# Altium footprint library RDM_ALT_PCB.PcbLib: 171 footprints (part 10 of 11)
Each footprint in its own frame and in the unit in brackets; x right, y up, seen from the top. Pads: shape width x height; smd on the part's side, far side on the other; paste and mask are expansions set on the pad; w line width, h text height; cw(c..) or ccw(c..) is an arc to the next point about the centre after c.
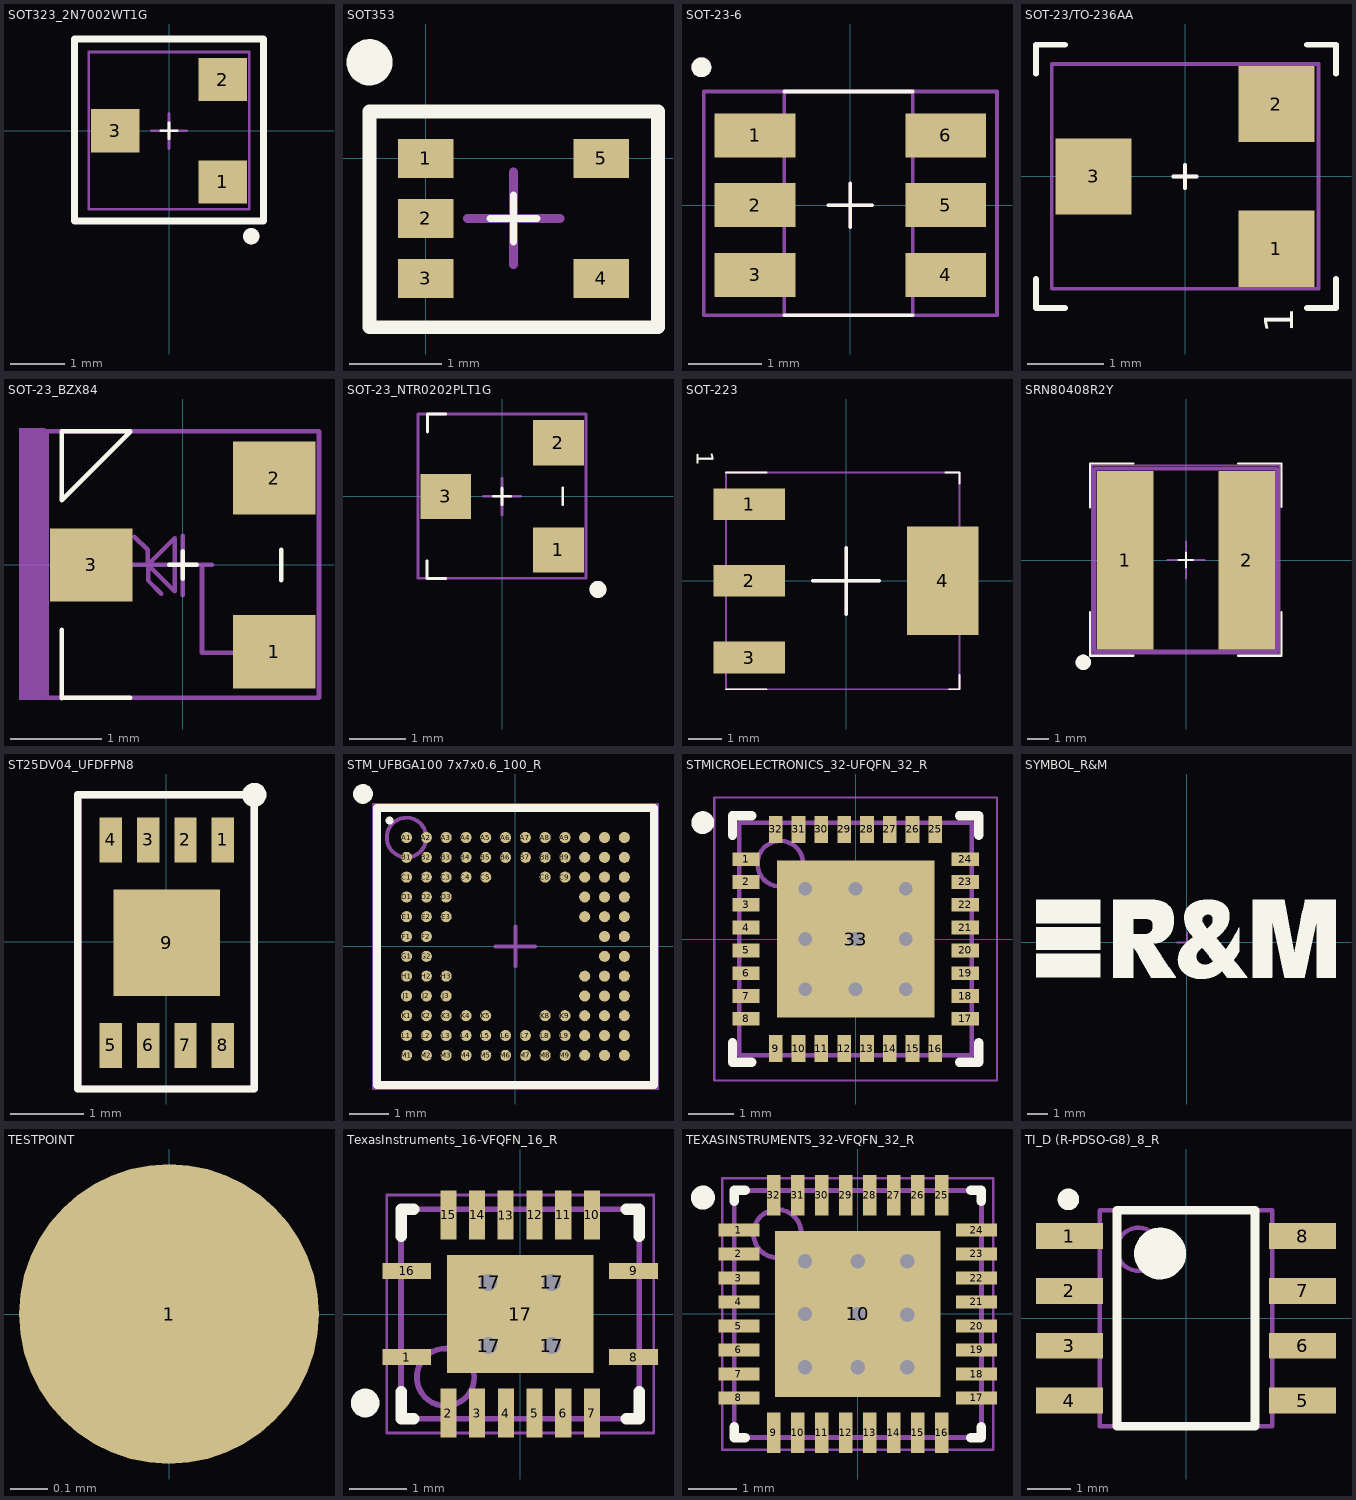
[diagram p9: the footprints below, top view; thin cyan lines are the x and y axes]

## SOT323_2N7002WT1G [mm] "N_MOSFET"
pads (3):
  rect 0.9x0.8 smd: 1(1,-0.95) 2(1,0.95) 3(-1,0)
Top Overlay:
  circle w0.3: c1.524,-1.956 r0
  lines w0.05: -0.15,0 0.15,0 ; 0,-0.15 0,0.15
  lines w0.127: -1.753,-1.676 -1.753,1.702 1.753,1.702 1.753,-1.676 -1.753,-1.676
Mechanical 13:
  circle w0.3: c1.524,-1.956 r0
Mechanical 15:
  circle w0.3: c1.524,-1.956 r0
  region: 0.669,-3.862
  region: 0.669,-3.862
  lines w0.05: -0.33,0 0,0 ; 0,-0.33 0,0 ; 0,-0.01 0,0.32 ; 0.33,0 0,0 ; -1.49,-1.455 -1.49,1.46 1.49,1.46 1.49,-1.455 -1.49,-1.455
3D body "BSS138_D87Z--3DModel-STEP-56544.STEP": height 1.16, standoff -0.04, extent -1.325,-1.46 1.075,1.46

## SOT353 [mm]
pads (5):
  rect 0.6x0.42 smd: 1(0,0) 2(0,-0.65) 3(0,-1.3) 4(1.9,-1.3) 5(1.9,0)
Top Overlay:
  circle w0.25: c-0.61,1.041 r0.125
  lines w0.076: 0.696,-0.65 1.204,-0.65 ; 0.95,-0.904 0.95,-0.396
  lines w0.15: -0.61,-1.829 2.515,-1.829 2.515,0.508 -0.61,0.508 -0.61,-1.829
Mechanical 15:
  lines w0.1: 0.45,-0.65 1.45,-0.65 ; 0.95,-1.15 0.95,-0.15
3D body "SOT353-1.stp": height 1.09, standoff 0, extent -0.18,-1.78 2.08,0.48

## SOT-23-6 [mm]
pads (6):
  rect 1.1x0.6 smd: 1(-1.3,0.95) 2(-1.3,0) 3(-1.3,-0.95) 4(1.3,-0.95) 5(1.3,0) 6(1.3,0.95)
Top Overlay:
  circle w0.15: c-2.032,1.88 r0.06
  lines w0.05: -0.9,-1.5 0.85,-1.5 ; -0.9,1.55 0.85,1.55 ; -0.3,0 0.3,0 ; 0,-0.3 0,0.3
Mechanical 13:
  circle w0.15: c-2.032,1.88 r0.06
  lines w0.05: -0.3,0 0.3,0 ; 0,-0.3 0,0.3 ; -0.9,-1.5 -0.9,1.55 0.85,1.55 0.85,-1.5 -0.9,-1.5
Mechanical 15:
  circle w0.15: c-2.031,1.88 r0.06
  lines w0.05: -0.3,0 0.3,0 ; 0,-0.3 0,0.3 ; -2,-1.5 2,-1.5 2,1.55 -2,1.55 -2,-1.5 ; -0.9,-1.5 -0.9,1.55 0.85,1.55 0.85,-1.5 -0.9,-1.5
3D body "3D-Body-SOT-23-6.step": height 1.09, standoff 0, extent -1.226,-1.397 1.2,1.397

## SOT-23/TO-236AA [mm] "TRANS NPN 20V 0.5A MINI3"
pads (3):
  rect 1x1 smd: 1(1.2,-0.95) 2(1.2,0.95) 3(-1.2,0)
Top Overlay:
  lines w0.05: -0.15,0 0.15,0 ; 0,-0.15 0,0.15
  lines w0.076: -1.956,-1.346 -1.956,-1.727 -1.575,-1.727 ; -1.956,1.346 -1.956,1.727 -1.575,1.727 ; 1.6,-1.727 1.981,-1.727 1.981,-1.346 ; 1.6,1.727 1.981,1.727 1.981,1.346
  text "1" at 1.422,-2.057 h0.38
Mechanical 13:
  lines w0.05: -0.15,0 0.15,0 ; 0,-0.15 0,0.15 ; -1.75,-1.475 1.75,-1.475 1.75,1.475 -1.75,1.475 -1.75,-1.475
Mechanical 15:
  region: 0.201,-0.951
  lines w0.05: -1.75,-1.475 1.75,-1.475 1.75,1.475 -1.75,1.475 -1.75,-1.475 ; -0.15,0 0.15,0 -0.15,0 ; 0,-0.15 0,0.15 0,-0.15
  text "B" at 0.65,-1.026 h0.25
  text "E" at 0.65,0.9 h0.25
  text "C" at -0.4,-0.1 h0.25
3D body "NPN_SOT-23_MINI3-G3-B.STEP": height 1.1, standoff -0.01, extent -1.29,-1.45 1.11,1.45

## SOT-23_BZX84 [mm] "only pin 3 and 1connected"
pads (3):
  rect 0.9x0.8 smd: 1(1,-0.95) 2(1,0.95) 3(-1,0)
Top Overlay:
  lines w0.05: -1.325,-1.46 -1.325,-0.709 ; -1.325,-1.455 -0.574,-1.455 ; -1.325,0.709 -1.325,1.46 -0.574,1.46 ; -1.323,0.709 -0.576,1.456 ; -0.15,0 0.15,0 ; 0,-0.15 0,0.15 ; 1.075,-0.17 1.075,0.165
Mechanical 13:
  rectangle: -1.79,-1.48 -1.5,1.5
Mechanical 15:
  circle w0.15: c-1.01,0 r0
  circle w0.15: c1.01,-0.96 r0
  rectangle: -1.791,-1.48 -1.501,1.5
  lines w0.05: -1.01,0 -0.39,0 ; -0.53,0.31 -0.385,0.165 -0.38,-0.17 -0.235,-0.315 ; -0.32,0 0.01,0 ; -0.09,0 0.21,0 0.21,-0.96 1.01,-0.96 ; -0.01,0 0.32,0 ; 0,-0.33 0,0 ; 0,-0.01 0,0.32 ; -1.49,-1.455 -1.49,1.46 1.49,1.46 1.49,-1.455 -1.49,-1.455 ; -0.38,0 -0.09,-0.29 -0.09,0.29 -0.38,0
3D body "BSS138_D87Z--3DModel-STEP-56544.STEP": height 1.16, standoff -0.04, extent -1.325,-1.46 1.075,1.46

## SOT-23_NTR0202PLT1G [mm] "P_MOSFET"
pads (3):
  rect 0.9x0.8 smd: 1(1,-0.95) 2(1,0.95) 3(-1,0)
Top Overlay:
  circle w0.3: c1.7,-1.65 r0
  lines w0.05: -1.33,-1.46 -1.33,-1.143 ; -1.325,-1.46 -1,-1.46 ; -1.325,1.143 -1.325,1.46 -1,1.46 ; -0.15,0 0.15,0 ; 0,-0.15 0,0.15 ; 1.075,-0.15 1.075,0.15
Mechanical 13:
  circle w0.3: c1.7,-1.65 r0
Mechanical 15:
  circle w0.3: c1.7,-1.65 r0
  region: 0.669,-3.862
  region: 0.669,-3.862
  lines w0.05: -0.33,0 0,0 ; 0,-0.33 0,0 ; 0,-0.01 0,0.32 ; 0.33,0 0,0 ; -1.49,-1.455 -1.49,1.46 1.49,1.46 1.49,-1.455 -1.49,-1.455
3D body "BSS138_D87Z--3DModel-STEP-56544.STEP": height 1.16, standoff -0.04, extent -1.325,-1.46 1.075,1.46

## SOT-223 [mm] "TO-261-4, TO-261AA"
pads (4):
  rect 2.15x0.95 smd: 1(-2.9,2.3) 2(-2.9,0) 3(-2.9,-2.3)
  rect 2.15x3.25 smd: 4(2.9,0)
Top Overlay:
  lines w0.05: -3.603,-3.252 -2.388,-3.251 ; -3.603,3.25 -2.388,3.251 ; 2.978,3.25 3.403,3.25 3.403,2.921 ; 3.074,-3.25 3.403,-3.25 3.403,-2.825
  lines w0.1: -1,0 1,0 ; 0,-1 0,1
  text "1" at -4.47,3.886 h0.5
Mechanical 13:
  lines w0.05: -3.603,-3.25 3.403,-3.25 3.403,3.25 -3.603,3.25 -3.603,-3.25
  lines w0.1: -1,0 1,0 ; 0,-1 0,1
  text "1" at -4.47,3.886 h0.5
Mechanical 15:
  lines w0.05: -0.3,0 0.3,0 ; -3.603,-3.25 -3.603,3.25 3.403,3.25 3.403,-3.25 -3.603,-3.25
  lines w0.1: -1,0 1,0 ; 0,-1 0,1
  text "1" at -4.47,3.886 h0.5
3D body "LD1117S18TR-3DModel.STEP": height 1.81, standoff -0.01, extent -3.603,-3.25 3.403,3.25

## SRN80408R2Y [mm]
pads (2):
  rect 2.6x8.2 smd: 1(-2.8,0) 2(2.8,0)
Top Overlay:
  lines w0.1: -4.42,-2.394 -4.42,-4.394 -2.42,-4.394 ; -4.42,2.42 -4.42,4.445 -2.429,4.445 ; -0.35,0 0.325,0 ; 0,-0.325 0,0.35 ; 2.394,-4.394 4.394,-4.394 4.394,-2.394 ; 2.394,4.445 4.394,4.445 4.394,2.445
  lines w0.5: -4.625,-4.7 ccw(c-4.725,-4.7) -4.625,-4.7
Mechanical 13:
  lines w0.1: -0.85,0 0.85,0 ; 0,-0.85 0,0.85
  lines w0.15: -4.2,-4.175 -4.2,4.2 4.175,4.2 4.175,-4.175 -4.2,-4.175
  lines w0.5: -4.625,-4.7 ccw(c-4.725,-4.7) -4.625,-4.7
Mechanical 15:
  lines w0.1: -0.85,0 0.85,0 ; 0,-0.85 0,0.85 ; -4.325,-4.3 4.3,-4.3 4.3,4.35 -4.325,4.35 -4.325,-4.3
  lines w0.5: -4.625,-4.7 ccw(c-4.725,-4.7) -4.625,-4.7
3D body "srn8040.stp": height 3.44, standoff -0.58, extent -4,-4 4,4.007

## ST25DV04_UFDFPN8 [mil] "UFDFPN8"
height 23.62
pads (9):
  rect 12x24 smd: 1(30.39,54.61) 2(10.39,54.61) 3(-9.61,54.61) 4(-29.61,54.61) 5(-29.61,-55.39) 6(-9.61,-55.39) 7(10.39,-55.39) 8(30.39,-55.39)
  rect 57.09x57.09 smd: 9(0.39,-0.39)
Top Overlay:
  circle w6.69: c47.24,78.74 r3.15
  lines w3.94: -47.24,-78.74 -47.24,78.74 ; -47.24,-78.74 47.24,-78.74 ; -47.24,-78.74 47.24,-78.74 ; -47.24,-78.74 -47.24,78.74 ; -47.24,-78.74 -47.24,78.74 ; -47.24,-78.74 47.24,-78.74 ; -47.24,-78.74 47.24,-78.74 ; -47.24,-78.74 -47.24,78.74 ; -47.24,78.74 47.24,78.74 ; -47.24,78.74 47.24,78.74 ; -47.24,78.74 47.24,78.74 ; -47.24,78.74 47.24,78.74 ; 47.24,-78.74 47.24,78.74 ; 47.24,-78.74 47.24,78.74 ; 47.24,-78.74 47.24,78.74 ; 47.24,-78.74 47.24,78.74
Mechanical 15:
  circle w3.94: c0,0 r1.97
  lines w3.94: -47.24,-78.74 47.24,-78.74 47.24,78.74 -47.24,78.74 -47.24,-78.74
3D body "User Library-UFDFPN8.STEP": height 22.16, standoff 0.5, extent -39.37,-59.06 39.37,59.06

## STM_UFBGA100 7x7x0.6_100_R [mm] "STM_UFBGA100 7x7x0.6_100_R"
height 0.6
pads (100):
  round 0.28 smd mask+0.09: A1(-2.75,2.75) A2(-2.25,2.75) A3(-1.75,2.75) A4(-1.25,2.75) A5(-0.75,2.75) A6(-0.25,2.75) A7(0.25,2.75) A8(0.75,2.75) A9(1.25,2.75) A10(1.75,2.75) A11(2.25,2.75) A12(2.75,2.75) B1(-2.75,2.25) B2(-2.25,2.25) B3(-1.75,2.25) B4(-1.25,2.25) B5(-0.75,2.25) B6(-0.25,2.25) B7(0.25,2.25) B8(0.75,2.25) B9(1.25,2.25) B10(1.75,2.25) B11(2.25,2.25) B12(2.75,2.25) C1(-2.75,1.75) C2(-2.25,1.75) C3(-1.75,1.75) C4(-1.25,1.75) C5(-0.75,1.75) C8(0.75,1.75) C9(1.25,1.75) C10(1.75,1.75) C11(2.25,1.75) C12(2.75,1.75) D1(-2.75,1.25) D2(-2.25,1.25) D3(-1.75,1.25) D10(1.75,1.25) D11(2.25,1.25) D12(2.75,1.25) E1(-2.75,0.75) E2(-2.25,0.75) E3(-1.75,0.75) E10(1.75,0.75) E11(2.25,0.75) E12(2.75,0.75) F1(-2.75,0.25) F2(-2.25,0.25) F11(2.25,0.25) F12(2.75,0.25) G1(-2.75,-0.25) G2(-2.25,-0.25) G11(2.25,-0.25) G12(2.75,-0.25) H1(-2.75,-0.75) H2(-2.25,-0.75) H3(-1.75,-0.75) H10(1.75,-0.75) H11(2.25,-0.75) H12(2.75,-0.75) J1(-2.75,-1.25) J2(-2.25,-1.25) J3(-1.75,-1.25) J10(1.75,-1.25) J11(2.25,-1.25) J12(2.75,-1.25) K1(-2.75,-1.75) K2(-2.25,-1.75) K3(-1.75,-1.75) K4(-1.25,-1.75) K5(-0.75,-1.75) K8(0.75,-1.75) K9(1.25,-1.75) K10(1.75,-1.75) K11(2.25,-1.75) K12(2.75,-1.75) L1(-2.75,-2.25) L2(-2.25,-2.25) L3(-1.75,-2.25) L4(-1.25,-2.25) L5(-0.75,-2.25) L6(-0.25,-2.25) L7(0.25,-2.25) L8(0.75,-2.25) L9(1.25,-2.25) L10(1.75,-2.25) L11(2.25,-2.25) L12(2.75,-2.25) M1(-2.75,-2.75) M2(-2.25,-2.75) M3(-1.75,-2.75) M4(-1.25,-2.75) M5(-0.75,-2.75) M6(-0.25,-2.75) M7(0.25,-2.75) M8(0.75,-2.75) M9(1.25,-2.75) M10(1.75,-2.75) M11(2.25,-2.75) M12(2.75,-2.75)
Top Overlay:
  circle w0.25: c-3.85,3.85 r0.125
  circle w0.2: c-3.175,3.175 r0.001
  lines w0.2: -3.5,-3.5 3.5,-3.5 3.5,3.5 -3.5,3.5 -3.5,-3.5
Mechanical 13:
  circle w0.1: c-2.75,2.75 r0.5
  lines w0.1: -3.5,-3.5 3.5,-3.5 3.5,3.5 -3.5,3.5 -3.5,-3.5
Mechanical 15:
  lines w0.05: -3.6,-3.6 3.6,-3.6 3.6,3.6 -3.6,3.6 -3.6,-3.6
  lines w0.1: -0.5,0 0.5,0 ; 0,-0.5 0,0.5
3D body: height 0.6, standoff 0.11, extent -3.5,-3.5 3.5,3.5

## STMICROELECTRONICS_32-UFQFN_32_R [mm]
pads (33):
  rect 0.6x0.3 smd: 1(-2.4,1.75) 2(-2.4,1.25) 3(-2.4,0.75) 4(-2.4,0.25) 5(-2.4,-0.25) 6(-2.4,-0.75) 7(-2.4,-1.25) 8(-2.4,-1.75) 17(2.4,-1.75) 18(2.4,-1.25) 19(2.4,-0.75) 20(2.4,-0.25) 21(2.4,0.25) 22(2.4,0.75) 23(2.4,1.25) 24(2.4,1.75)
  rect 0.3x0.6 smd: 9(-1.75,-2.4) 10(-1.25,-2.4) 11(-0.75,-2.4) 12(-0.25,-2.4) 13(0.25,-2.4) 14(0.75,-2.4) 15(1.25,-2.4) 16(1.75,-2.4) 25(1.75,2.4) 26(1.25,2.4) 27(0.75,2.4) 28(0.25,2.4) 29(-0.25,2.4) 30(-0.75,2.4) 31(-1.25,2.4) 32(-1.75,2.4)
  rect 3.45x3.45 smd: 33(0,0)
via -1.1,1.1 diameter 0.5 hole 0.3
via 0,1.1 diameter 0.5 hole 0.3
via 1.1,1.1 diameter 0.5 hole 0.3
via -1.1,0 diameter 0.5 hole 0.3
via 0,0 diameter 0.5 hole 0.3
via 1.1,0 diameter 0.5 hole 0.3
via -1.1,-1.1 diameter 0.5 hole 0.3
via 0,-1.1 diameter 0.5 hole 0.3
via 1.1,-1.1 diameter 0.5 hole 0.3
Top Overlay:
  circle w0.25: c-3.35,2.55 r0.125
  lines w0.2: -2.7,-2.275 -2.7,-2.7 -2.275,-2.7 ; -2.7,2.275 -2.7,2.7 -2.275,2.7 ; 2.275,-2.7 2.7,-2.7 2.7,-2.275 ; 2.275,2.7 2.7,2.7 2.7,2.275
Mechanical 13:
  circle w0.1: c-1.65,1.65 r0.5
  lines w0.1: -2.55,-2.55 -2.55,2.55 2.55,2.55 2.55,-2.55 -2.55,-2.55
Mechanical 15:
  lines w0.05: -3.1,-3.1 -3.1,3.1 3.1,3.1 3.1,-3.1 -3.1,-3.1
  lines w0.1: -0.5,0 0.5,0 ; 0,-0.5 0,0.5
3D body "QFN50P500X500X60_HS-33N.step": height 0.6, standoff 0, extent -2.6,-2.6 2.6,2.6

## SYMBOL_R&M [mm] "Reichle & De-Massari printing"
Top Overlay:
  drawing of 1139 lines, arcs and shapes, not listed
Mechanical 15:
  lines w0.1: -0.5,0 0.5,0 ; 0,-0.5 0,0.5

## TESTPOINT [mm] "Testpoint"
pads (1):
  round 0.8 smd paste-0.8 mask+0.102: 1(0,0)

## TexasInstruments_16-VFQFN_16_R [mm]
pads (21):
  rect 0.85x0.28 smd: 1(-1.975,-0.75) 8(1.975,-0.75) 9(1.975,0.75) 16(-1.975,0.75)
  rect 0.28x0.85 smd: 2(-1.25,-1.725) 3(-0.75,-1.725) 4(-0.25,-1.725) 5(0.25,-1.725) 6(0.75,-1.725) 7(1.25,-1.725) 10(1.25,1.725) 11(0.75,1.725) 12(0.25,1.725) 13(-0.254,1.724) 14(-0.75,1.725) 15(-1.25,1.725)
  round 0.55 hole 0.3: 17(-0.55,-0.55) 17(-0.55,0.55) 17(0.55,-0.55) 17(0.55,0.55)
  rect 2.55x2.05 smd: 17(0,0)
Top Overlay:
  circle w0.25: c-2.7,-1.55 r0.125
  lines w0.2: -2.075,-1.35 -2.075,-1.825 -1.85,-1.825 ; -2.075,1.35 -2.075,1.825 -1.85,1.825 ; 1.85,-1.825 2.075,-1.825 2.075,-1.35 ; 1.85,1.825 2.075,1.825 2.075,1.35
Mechanical 13:
  circle w0.1: c-1.3,-1.1 r0.5
  lines w0.1: -2.075,-1.825 -2.075,1.825 2.075,1.825 2.075,-1.825 -2.075,-1.825
Mechanical 15:
  lines w0.05: -2.325,-2.075 -2.325,2.075 2.325,2.075 2.325,-2.075 -2.325,-2.075
  lines w0.1: -0.5,0 0.5,0 ; 0,-0.5 0,0.5
3D body "PQFN50P400X350X100_HS-17N.step": height 1, standoff 0, extent -2.075,-1.825 2.075,1.825

## TEXASINSTRUMENTS_32-VFQFN_32_R [mm]
pads (33):
  rect 0.85x0.28 smd: 1(-2.475,1.75) 2(-2.475,1.25) 3(-2.475,0.75) 4(-2.475,0.25) 5(-2.475,-0.25) 6(-2.475,-0.75) 7(-2.475,-1.25) 8(-2.475,-1.75) 17(2.475,-1.75) 18(2.475,-1.25) 19(2.475,-0.75) 20(2.475,-0.25) 21(2.475,0.25) 22(2.475,0.75) 23(2.475,1.25) 24(2.475,1.75)
  rect 0.28x0.85 smd: 9(-1.75,-2.475) 10(-1.25,-2.475) 11(-0.75,-2.475) 12(-0.25,-2.475) 13(0.25,-2.475) 14(0.75,-2.475) 15(1.25,-2.475) 16(1.75,-2.475) 25(1.75,2.475) 26(1.25,2.475) 27(0.75,2.475) 28(0.25,2.475) 29(-0.25,2.475) 30(-0.75,2.475) 31(-1.25,2.475) 32(-1.75,2.475)
  rect 3.45x3.45 smd: 10(0,0)
via -1.1,-1.112 diameter 0.55 hole 0.3
via 1.028,-0.012 diameter 0.55 hole 0.3
via 1.028,1.1 diameter 0.55 hole 0.3
via 1.028,-1.112 diameter 0.55 hole 0.3
via 0,-1.112 diameter 0.55 hole 0.3
via -1.1,0 diameter 0.55 hole 0.3
via 0,0 diameter 0.55 hole 0.3
via -1.1,1.1 diameter 0.55 hole 0.3
via 0,1.1 diameter 0.55 hole 0.3
Top Overlay:
  circle w0.25: c-3.225,2.425 r0.125
  lines w0.2: -2.575,-2.35 -2.575,-2.575 -2.35,-2.575 ; -2.575,2.35 -2.575,2.575 -2.35,2.575 ; 2.35,-2.575 2.575,-2.575 2.575,-2.35 ; 2.35,2.575 2.575,2.575 2.575,2.35
Mechanical 13:
  circle w0.1: c-1.675,1.675 r0.5
  lines w0.1: -2.575,-2.575 2.575,-2.575 2.575,2.575 -2.575,2.575 -2.575,-2.575
Mechanical 15:
  lines w0.05: -2.825,-2.825 2.825,-2.825 2.825,2.825 -2.825,2.825 -2.825,-2.825
  lines w0.1: -0.5,0 0.5,0 ; 0,-0.5 0,0.5
3D body "PQFN50P500X500X100_HS-33N.step": height 1, standoff 0, extent -2.575,-2.575 2.575,2.575

## TI_D (R-PDSO-G8)_8_R [mm] "TI_D (R-PDSO-G8)_8_R"
height 1.75
pads (8):
  rect 1.55x0.6 smd: 1(-2.7,1.905) 2(-2.7,0.635) 3(-2.7,-0.635) 4(-2.7,-1.905) 5(2.7,-1.905) 6(2.7,-0.635) 7(2.7,0.635) 8(2.7,1.905)
Top Overlay:
  circle w0.25: c-2.725,2.755 r0.125
  circle w0.6: c-0.6,1.5 r0.3
  lines w0.2: -1.6,-2.5 -1.6,2.5 1.6,2.5 1.6,-2.5 -1.6,-2.5
Mechanical 13:
  circle w0.1: c-1.1,1.6 r0.5
  lines w0.1: -2,-2.5 -2,2.5 2,2.5 2,-2.5 -2,-2.5
3D body "SOIC-8akaD0008AakaM08A.stp": height 1.63, standoff 0, extent -3,-2.45 3,2.45